# Altium footprint library Active.PcbLib: 325 footprints (part 2 of 23)
Each footprint in its own frame and in the unit in brackets; x right, y up, seen from the top. Pads: shape width x height; smd on the part's side, far side on the other; paste and mask are expansions set on the pad; w line width, h text height; cw(c..) or ccw(c..) is an arc to the next point about the centre after c.
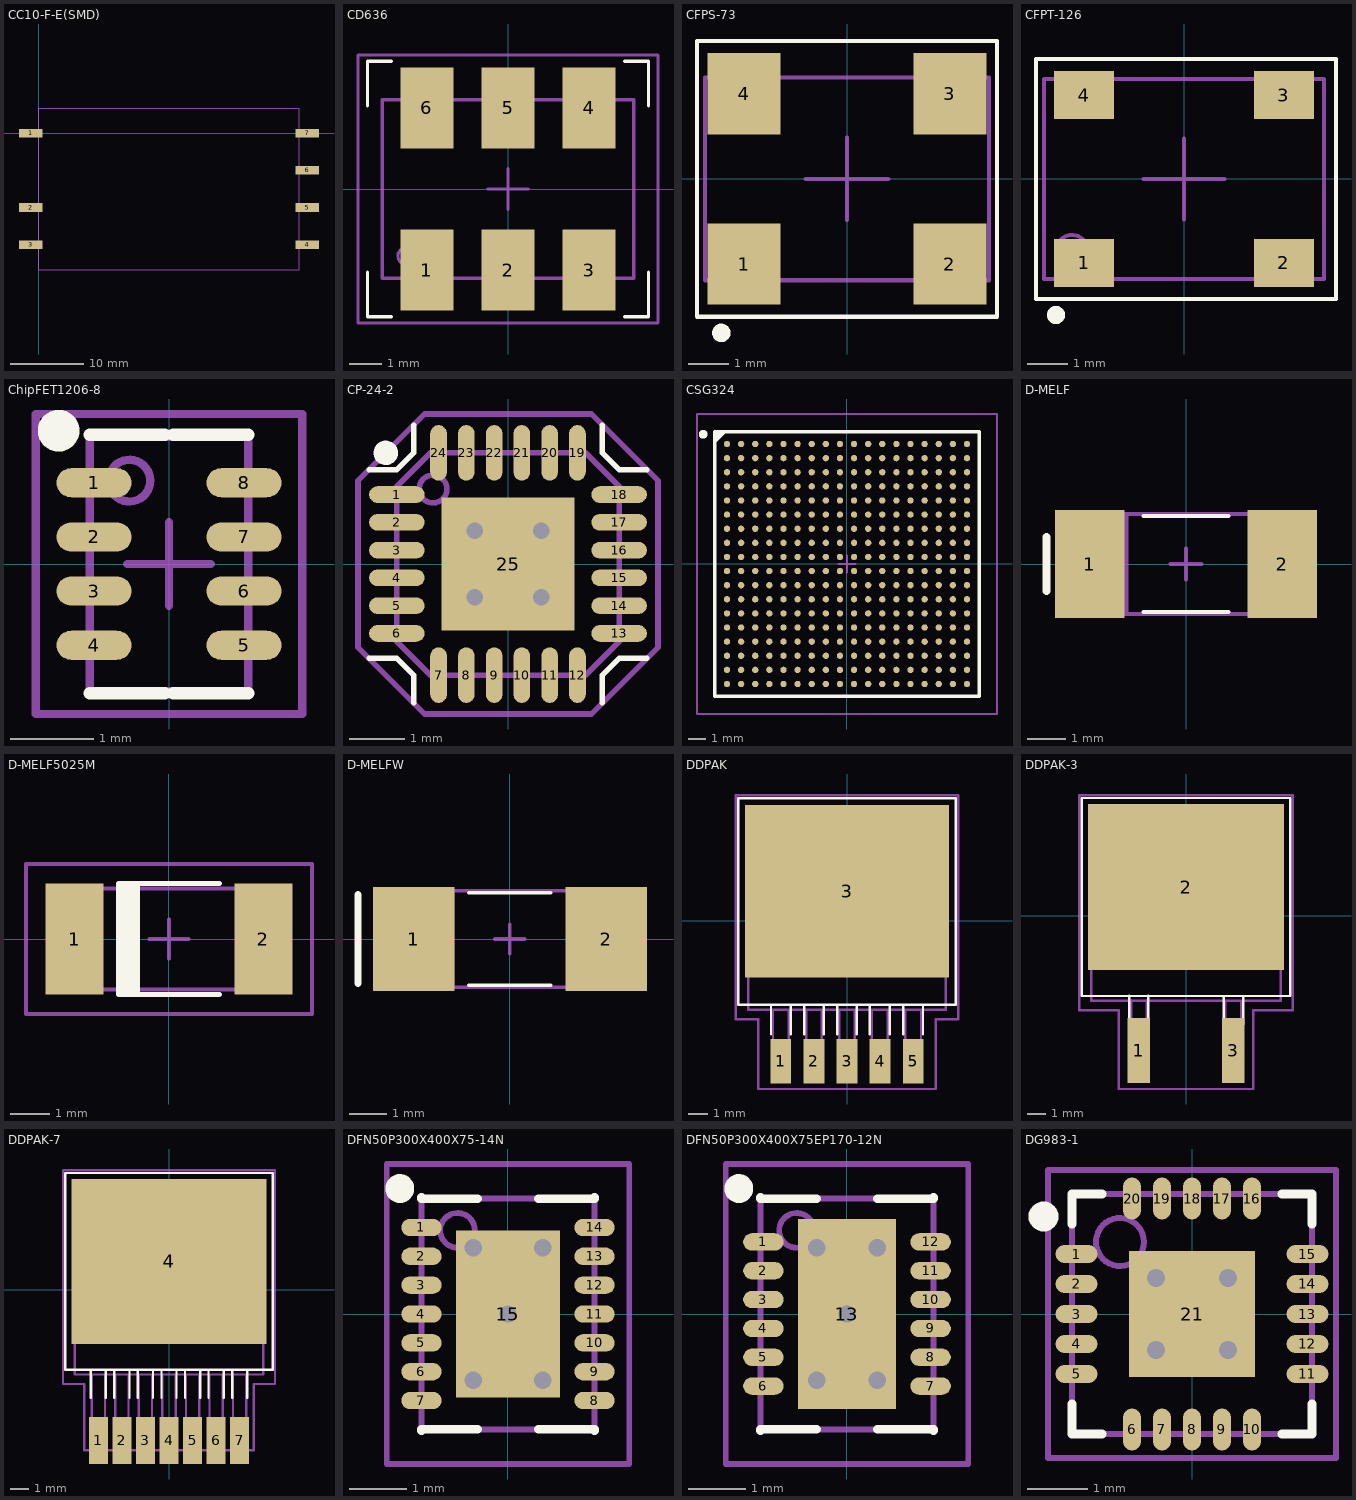
[diagram p1: the footprints below, top view; thin cyan lines are the x and y axes]

## CC10-F-E(SMD) [mm] "CC3-F-E, DIP 11pin, Body 35.56x22.6x8.5mm (LxWxH), R5.08mm"
height 8.5
pads (7):
  rect 3.2x1.2 smd: 1(-1.12,0) 2(-1.12,-10.16) 3(-1.12,-15.24) 4(36.68,-15.24) 5(36.68,-10.16) 6(36.68,-5.08) 7(36.68,0)
Mechanical 13:
  lines w0.127: 0,-18.64 35.56,-18.64 ; 0,-18.62 0,3.38 35.56,3.38 35.56,-18.62
3D body: height 8.5, standoff 0, extent 0,-18.64 35.56,3.38
3D body: height 8.51, standoff 8.5, extent 1.544,-1.016 3.536,0.98

## CD636 [mm] "X3 Frequency Multiplier 6 pin R2.54mm"
height 4.11
pads (6):
  rect 1.65x2.54 smd: 1(-2.54,-2.54) 2(0,-2.54) 3(2.54,-2.54) 4(2.54,2.54) 5(0,2.54) 6(-2.54,2.54)
Top Overlay:
  lines w0.102: -4.4,-2.6 -4.4,-4 -3.65,-4 ; -4.4,2.6 -4.4,4 -3.65,4 ; 3.65,-4 4.4,-4 4.4,-2.6 ; 3.65,4 4.4,4 4.4,2.6
Mechanical 13:
  lines w0.102: -2.95,-2.1 cw(c-3.2,-2.1) -2.95,-2.097 ; -3.937,-2.794 3.937,-2.794 3.937,2.794 -3.937,2.794 -3.937,-2.794
Mechanical 15:
  lines w0.102: -0.635,0 0.635,0 ; 0,-0.635 0,0.635 ; -4.7,-4.2 -4.7,4.2 4.7,4.2 4.7,-4.2 -4.7,-4.2
3D body: height 4.11, standoff 0, extent -3.937,-2.794 3.937,2.794
3D body: height 4.14, standoff 4.11, extent -3.449,-2.349 -2.95,-1.841

## CFPS-73 [mm] "Ceramic oscillator 7x5x1.8mm SMD"
height 1.8
pads (4):
  rect 1.8x2 smd: 1(-2.54,-2.1) 2(2.54,-2.1) 3(2.54,2.1) 4(-2.54,2.1)
Top Overlay:
  circle w0.254: c-3.1,-3.8 r0.1
  lines w0.102: -3.7,-3.4 3.7,-3.4 3.7,3.4 -3.7,3.4 -3.7,-3.4
Mechanical 13:
  circle w0.1: c-2.8,-1.8 r0.4
  lines w0.102: -3.5,-2.5 -3.5,2.5 3.5,2.5 3.5,-2.5 -3.5,-2.5
Mechanical 15:
  lines w0.102: -1.016,0 1.016,0 ; 0,-1.016 0,1.016
3D body: height 1.8, standoff 0, extent -3.5,-2.5 3.5,2.5
3D body: height 1.81, standoff 1.8, extent -3.2,-2.2 -2.4,-1.4

## CFPT-126 [mm] "Ceramic oscillator 7x5x2mm SMD"
height 2
pads (4):
  rect 1.5x1.2 smd: 1(-2.5,-2.1) 2(2.5,-2.1) 3(2.5,2.1) 4(-2.5,2.1)
Top Overlay:
  circle w0.254: c-3.2,-3.4 r0.1
  lines w0.102: -3.7,-3 -3.7,3 3.8,3 3.8,-3 -3.7,-3
Mechanical 13:
  circle w0.1: c-2.8,-1.8 r0.4
  lines w0.102: -3.5,-2.5 3.5,-2.5 3.5,2.5 -3.5,2.5 -3.5,-2.5
Mechanical 15:
  lines w0.102: -1.016,0 1.016,0 ; 0,-1.016 0,1.016
3D body: height 2, standoff 0, extent -3.5,-2.5 3.5,2.5
3D body: height 2.01, standoff 2, extent -3.2,-2.2 -2.4,-1.4

## ChipFET1206-8 [mm] "Chip FET 8-Leads, Body 3,0x1,9mm (max), Pitch 0,65mm, IPC Low Density"
height 1.1
pads (8):
  oval 0.9x0.35 smd mask+0.051: 1(-0.9,0.975) 2(-0.9,0.325) 3(-0.9,-0.325) 4(-0.9,-0.975) 5(0.9,-0.975) 6(0.9,-0.325) 7(0.9,0.325) 8(0.9,0.975)
Top Overlay:
  circle w0.25: c-1.325,1.6 r0.125
  lines w0.15: -0.95,-1.55 -0.05,-1.55 ; -0.95,1.55 -0.05,1.55 ; 0.05,-1.55 0.95,-1.55 ; 0.05,1.55 0.95,1.55
Mechanical 13:
  circle w0.1: c-0.475,1 r0.25
  lines w0.1: -0.95,-1.525 -0.95,1.525 0.95,1.525 0.95,-1.525 -0.95,-1.525
Mechanical 15:
  lines w0.1: -0.5,0 0.5,0 ; 0,-0.5 0,0.5 ; -1.6,-1.8 -1.6,1.8 1.6,1.8 1.6,-1.8 -1.6,-1.8
3D body: height 1.1, standoff 0.01, extent -0.95,-1.525 0.95,1.525
3D body: height 1.11, standoff 1.1, extent -0.73,0.75 -0.23,1.25

## CP-24-2 [mm] "24pin LFCSP_VQ Waffle pack"
height 1.016
pads (25):
  oval 1x0.3 smd mask+0.025: 1(-2,1.25) 2(-2,0.75) 3(-2,0.25) 4(-2,-0.25) 5(-2,-0.75) 6(-2,-1.25) 13(2,-1.25) 14(2,-0.75) 15(2,-0.25) 16(2,0.25) 17(2,0.75) 18(2,1.25)
  oval 0.3x1 smd mask+0.025: 7(-1.25,-2) 8(-0.75,-2) 9(-0.25,-2) 10(0.25,-2) 11(0.75,-2) 12(1.25,-2) 19(1.25,2) 20(0.75,2) 21(0.25,2) 22(-0.25,2) 23(-0.75,2) 24(-1.25,2)
  rect 2.4x2.4 smd paste-5 mask-5: 25(0,0)
via 0.6,-0.6 diameter 0.65 hole 0.3
via 0.6,0.6 diameter 0.65 hole 0.3
via -0.6,0.6 diameter 0.65 hole 0.3
via -0.6,-0.6 diameter 0.65 hole 0.3
Top Overlay:
  circle w0.1: c-2.2,2 r0.17
  circle w0.15: c-2.2,2 r0.06
  lines w0.1: -2.5,-1.7 -2,-1.7 -1.7,-2 -1.7,-2.5 ; -2.5,1.7 -2,1.7 -1.7,2 -1.7,2.5 ; 1.7,-2.5 1.7,-2 2,-1.7 2.5,-1.7 ; 1.7,2.5 1.7,2 2,1.7 2.5,1.7
Top Paste:
  region: -0.45,-1.2 -0.45,-0.95 -0.25,-0.75 0.25,-0.75 0.45,-0.95 0.45,-1.2
  region: 1.2,-0.45 0.95,-0.45 0.75,-0.25 0.75,0.25 0.95,0.45 1.2,0.45
  region: 1.2,0.725 0.975,0.725 0.75,0.95 0.75,1.2 0.975,1.2 1.2,1.2
  region: 0.725,-1.2 0.725,-0.975 0.95,-0.75 1.2,-0.75 1.2,-0.975 1.2,-1.2
  region: -1.2,-0.725 -0.975,-0.725 -0.75,-0.95 -0.75,-1.2 -0.975,-1.2 -1.2,-1.2
  region: -0.725,1.2 -0.725,0.975 -0.95,0.75 -1.2,0.75 -1.2,0.975 -1.2,1.2
  region: -0.25,0.45 -0.45,0.25 -0.45,-0.25 -0.25,-0.45 0.25,-0.45 0.45,-0.25 0.45,0.25 0.25,0.45
  region: -0.45,1.2 -0.45,0.95 -0.25,0.75 0.25,0.75 0.45,0.95 0.45,1.2
  region: -1.2,-0.45 -0.95,-0.45 -0.75,-0.25 -0.75,0.25 -0.95,0.45 -1.2,0.45
Top Solder:
  region: 1.25,1.25 0.6,1.25 0.6,0.9 0.63,0.9 0.717,0.883 0.816,0.816 0.883,0.717 0.9,0.63 0.9,0.6 0.9,0.57 0.883,0.483 0.816,0.384 0.717,0.317 0.63,0.3 0.6,0.3 0.57,0.3 0.483,0.317 0.384,0.384 0.317,0.483 0.3,0.57 0.3,0.6 0.3,0.63 0.317,0.717 0.384,0.816 0.483,0.883 0.57,0.9 0.6,0.9 0.6,1.25 0,1.25 0,0 1.25,0
  region: 1.25,-1.25 0.6,-1.25 0.6,-0.9 0.63,-0.9 0.717,-0.883 0.816,-0.816 0.883,-0.717 0.9,-0.63 0.9,-0.6 0.9,-0.57 0.883,-0.483 0.816,-0.384 0.717,-0.317 0.63,-0.3 0.6,-0.3 0.57,-0.3 0.483,-0.317 0.384,-0.384 0.317,-0.483 0.3,-0.57 0.3,-0.6 0.3,-0.63 0.317,-0.717 0.384,-0.816 0.483,-0.883 0.57,-0.9 0.6,-0.9 0.6,-1.25 0,-1.25 0,0 1.25,0
  region: -1.25,-1.25 -0.6,-1.25 -0.6,-0.9 -0.63,-0.9 -0.717,-0.883 -0.816,-0.816 -0.883,-0.717 -0.9,-0.63 -0.9,-0.6 -0.9,-0.57 -0.883,-0.483 -0.816,-0.384 -0.717,-0.317 -0.63,-0.3 -0.6,-0.3 -0.57,-0.3 -0.483,-0.317 -0.384,-0.384 -0.317,-0.483 -0.3,-0.57 -0.3,-0.6 -0.3,-0.63 -0.317,-0.717 -0.384,-0.816 -0.483,-0.883 -0.57,-0.9 -0.6,-0.9 -0.6,-1.25 0,-1.25 0,0 -1.25,0
  region: -1.25,1.25 -0.6,1.25 -0.6,0.9 -0.63,0.9 -0.717,0.883 -0.816,0.816 -0.883,0.717 -0.9,0.63 -0.9,0.6 -0.9,0.57 -0.883,0.483 -0.816,0.384 -0.717,0.317 -0.63,0.3 -0.6,0.3 -0.57,0.3 -0.483,0.317 -0.384,0.384 -0.317,0.483 -0.3,0.57 -0.3,0.6 -0.3,0.63 -0.317,0.717 -0.384,0.816 -0.483,0.883 -0.57,0.9 -0.6,0.9 -0.6,1.25 0,1.25 0,0 -1.25,0
Mechanical 13:
  circle w0.1: c-1.35,1.35 r0.25
  lines w0.1: -2,-1.4 -1.4,-2 1.4,-2 2,-1.4 2,1.4 1.4,2 1.1,2 -1.4,2 -2,1.4 -2,-1.4
Mechanical 15:
  lines w0.1: -0.4,0 0.4,0 ; 0,-0.4 0,0.4 ; -2.7,-1.5 -2.7,1.5 -1.5,2.7 1.5,2.7 2.7,1.5 2.7,-1.5 1.5,-2.7 -1.5,-2.7 -2.7,-1.5
3D body: height 1.01, standoff 0.99, extent -1.648,1.051 -1.05,1.649
3D body: height 1, standoff 0, extent -2,-2 2,2

## CSG324 [mm] "BGA, 324-Leads, Body 15x15mm, Pitch 0.8mm"
height 1.5
pads (324):
  round 0.36 smd: A1(-6.8,6.8) A2(-6,6.8) A3(-5.2,6.8) A4(-4.4,6.8) A5(-3.6,6.8) A6(-2.8,6.8) A7(-2,6.8) A8(-1.2,6.8) A9(-0.4,6.8) A10(0.4,6.8) A11(1.2,6.8) A12(2,6.8) A13(2.8,6.8) A14(3.6,6.8) A15(4.4,6.8) A16(5.2,6.8) A17(6,6.8) A18(6.8,6.8) B1(-6.8,6) B2(-6,6) B3(-5.2,6) B4(-4.4,6) B5(-3.6,6) B6(-2.8,6) B7(-2,6) B8(-1.2,6) B9(-0.4,6) B10(0.4,6) B11(1.2,6) B12(2,6) B13(2.8,6) B14(3.6,6) B15(4.4,6) B16(5.2,6) B17(6,6) B18(6.8,6) C1(-6.8,5.2) C2(-6,5.2) C3(-5.2,5.2) C4(-4.4,5.2) C5(-3.6,5.2) C6(-2.8,5.2) C7(-2,5.2) C8(-1.2,5.2) C9(-0.4,5.2) C10(0.4,5.2) C11(1.2,5.2) C12(2,5.2) C13(2.8,5.2) C14(3.6,5.2) C15(4.4,5.2) C16(5.2,5.2) C17(6,5.2) C18(6.8,5.2) D1(-6.8,4.4) D2(-6,4.4) D3(-5.2,4.4) D4(-4.4,4.4) D5(-3.6,4.4) D6(-2.8,4.4) D7(-2,4.4) D8(-1.2,4.4) D9(-0.4,4.4) D10(0.4,4.4) D11(1.2,4.4) D12(2,4.4) D13(2.8,4.4) D14(3.6,4.4) D15(4.4,4.4) D16(5.2,4.4) D17(6,4.4) D18(6.8,4.4) E1(-6.8,3.6) E2(-6,3.6) E3(-5.2,3.6) E4(-4.4,3.6) E5(-3.6,3.6) E6(-2.8,3.6) E7(-2,3.6) E8(-1.2,3.6) E9(-0.4,3.6) E10(0.4,3.6) E11(1.2,3.6) E12(2,3.6) E13(2.8,3.6) E14(3.6,3.6) E15(4.4,3.6) E16(5.2,3.6) E17(6,3.6) E18(6.8,3.6) F1(-6.8,2.8) F2(-6,2.8) F3(-5.2,2.8) F4(-4.4,2.8) F5(-3.6,2.8) F6(-2.8,2.8) F7(-2,2.8) F8(-1.2,2.8) F9(-0.4,2.8) F10(0.4,2.8) F11(1.2,2.8) F12(2,2.8) F13(2.8,2.8) F14(3.6,2.8) F15(4.4,2.8) F16(5.2,2.8) F17(6,2.8) F18(6.8,2.8) G1(-6.8,2) G2(-6,2) G3(-5.2,2) G4(-4.4,2) G5(-3.6,2) G6(-2.8,2) G7(-2,2) G8(-1.2,2) G9(-0.4,2) G10(0.4,2) G11(1.2,2) G12(2,2) G13(2.8,2) G14(3.6,2) G15(4.4,2) G16(5.2,2) G17(6,2) G18(6.8,2) H1(-6.8,1.2) H2(-6,1.2) H3(-5.2,1.2) H4(-4.4,1.2) H5(-3.6,1.2) H6(-2.8,1.2) H7(-2,1.2) H8(-1.2,1.2) H9(-0.4,1.2) H10(0.4,1.2) H11(1.2,1.2) H12(2,1.2) H13(2.8,1.2) H14(3.6,1.2) H15(4.4,1.2) H16(5.2,1.2) H17(6,1.2) H18(6.8,1.2) J1(-6.8,0.4) J2(-6,0.4) J3(-5.2,0.4) J4(-4.4,0.4) J5(-3.6,0.4) J6(-2.8,0.4) J7(-2,0.4) J8(-1.2,0.4) J9(-0.4,0.4) J10(0.4,0.4) J11(1.2,0.4) J12(2,0.4) J13(2.8,0.4) J14(3.6,0.4) J15(4.4,0.4) J16(5.2,0.4) J17(6,0.4) J18(6.8,0.4) K1(-6.8,-0.4) K2(-6,-0.4) K3(-5.2,-0.4) K4(-4.4,-0.4) K5(-3.6,-0.4) K6(-2.8,-0.4) K7(-2,-0.4) K8(-1.2,-0.4) K9(-0.4,-0.4) K10(0.4,-0.4) K11(1.2,-0.4) K12(2,-0.4) K13(2.8,-0.4) K14(3.6,-0.4) K15(4.4,-0.4) K16(5.2,-0.4) K17(6,-0.4) K18(6.8,-0.4) L1(-6.8,-1.2) L2(-6,-1.2) L3(-5.2,-1.2) L4(-4.4,-1.2) L5(-3.6,-1.2) L6(-2.8,-1.2) L7(-2,-1.2) L8(-1.2,-1.2) L9(-0.4,-1.2) L10(0.4,-1.2) L11(1.2,-1.2) L12(2,-1.2) L13(2.8,-1.2) L14(3.6,-1.2) L15(4.4,-1.2) L16(5.2,-1.2) L17(6,-1.2) L18(6.8,-1.2) M1(-6.8,-2) M2(-6,-2) M3(-5.2,-2) M4(-4.4,-2) M5(-3.6,-2) M6(-2.8,-2) M7(-2,-2) M8(-1.2,-2) M9(-0.4,-2) M10(0.4,-2) M11(1.2,-2) M12(2,-2) M13(2.8,-2) M14(3.6,-2) M15(4.4,-2) M16(5.2,-2) M17(6,-2) M18(6.8,-2) N1(-6.8,-2.8) N2(-6,-2.8) N3(-5.2,-2.8) N4(-4.4,-2.8) N5(-3.6,-2.8) N6(-2.8,-2.8) N7(-2,-2.8) N8(-1.2,-2.8) N9(-0.4,-2.8) N10(0.4,-2.8) N11(1.2,-2.8) N12(2,-2.8) N13(2.8,-2.8) N14(3.6,-2.8) N15(4.4,-2.8) N16(5.2,-2.8) N17(6,-2.8) N18(6.8,-2.8) P1(-6.8,-3.6) P2(-6,-3.6) P3(-5.2,-3.6) P4(-4.4,-3.6) P5(-3.6,-3.6) P6(-2.8,-3.6) P7(-2,-3.6) P8(-1.2,-3.6) P9(-0.4,-3.6) P10(0.4,-3.6) P11(1.2,-3.6) P12(2,-3.6) P13(2.8,-3.6) P14(3.6,-3.6) P15(4.4,-3.6) P16(5.2,-3.6) P17(6,-3.6) P18(6.8,-3.6) R1(-6.8,-4.4) R2(-6,-4.4) R3(-5.2,-4.4) R4(-4.4,-4.4) R5(-3.6,-4.4) R6(-2.8,-4.4) R7(-2,-4.4) R8(-1.2,-4.4) R9(-0.4,-4.4) R10(0.4,-4.4) R11(1.2,-4.4) R12(2,-4.4) R13(2.8,-4.4) R14(3.6,-4.4) R15(4.4,-4.4) R16(5.2,-4.4) R17(6,-4.4) R18(6.8,-4.4) T1(-6.8,-5.2) T2(-6,-5.2) T3(-5.2,-5.2) T4(-4.4,-5.2) T5(-3.6,-5.2) T6(-2.8,-5.2) T7(-2,-5.2) T8(-1.2,-5.2) T9(-0.4,-5.2) T10(0.4,-5.2) T11(1.2,-5.2) T12(2,-5.2) T13(2.8,-5.2) T14(3.6,-5.2) T15(4.4,-5.2) T16(5.2,-5.2) T17(6,-5.2) T18(6.8,-5.2) U1(-6.8,-6) U2(-6,-6) U3(-5.2,-6) U4(-4.4,-6) U5(-3.6,-6) U6(-2.8,-6) U7(-2,-6) U8(-1.2,-6) U9(-0.4,-6) U10(0.4,-6) U11(1.2,-6) U12(2,-6) U13(2.8,-6) U14(3.6,-6) U15(4.4,-6) U16(5.2,-6) U17(6,-6) U18(6.8,-6) V1(-6.8,-6.8) V2(-6,-6.8) V3(-5.2,-6.8) V4(-4.4,-6.8) V5(-3.6,-6.8) V6(-2.8,-6.8) V7(-2,-6.8) V8(-1.2,-6.8) V9(-0.4,-6.8) V10(0.4,-6.8) V11(1.2,-6.8) V12(2,-6.8) V13(2.8,-6.8) V14(3.6,-6.8) V15(4.4,-6.8) V16(5.2,-6.8) V17(6,-6.8) V18(6.8,-6.8)
Top Overlay:
  circle w0.25: c-8.15,7.35 r0.125
  region: -6.92,7.5 -7.5,6.92 -7.5,7.5
  lines w0.2: -7.5,6.92 -6.92,7.5 ; -7.5,-7.5 -7.5,7.5 7.5,7.5 7.5,-7.5 -7.5,-7.5
Mechanical 13:
  lines w0.1: -7.5,-7.5 -7.5,7.5 7.5,7.5 7.5,-7.5 -7.5,-7.5
Mechanical 15:
  lines w0.1: -0.5,0 0.5,0 ; 0,-0.5 0,0.5 ; -8.5,-8.5 -8.5,8.5 8.5,8.5 8.5,-8.5 -8.5,-8.5
3D body: height 1.51, standoff 1.5, extent -6.9,5.901 -5.904,6.899
3D body: height 1.5, standoff 0, extent -7.5,-7.5 7.5,7.5

## D-MELF [mm] "Diode MELF glass"
height 2.5
pads (2):
  rect 1.8x2.8 smd: 1(-2.5,0) 2(2.5,0)
Top Overlay:
  lines w0.102: -1.1,-1.25 1.1,-1.25 ; -1.1,1.25 1.1,1.25
  lines w0.2: -3.625,-0.7 -3.625,0.7
Mechanical 13:
  lines w0.102: -2.05,-1.25 -2.05,1.25 ; -1.95,-1.25 -1.95,1.25 ; -1.85,-1.25 -1.85,1.25 ; -1.75,-1.25 -1.75,1.25 ; -1.65,-1.25 -1.65,1.25 ; -1.55,-1.25 -1.55,1.25 ; -2.5,-1.3 -2.5,-0.7 -2.5,1.3 2.5,1.3 2.5,-1.3 -2.5,-1.3
Mechanical 15:
  lines w0.102: -0.4,0 0.4,0 ; 0,-0.4 0,0.4
3D body: height 1.6, standoff 0, extent -2.5,-1.3 2.5,1.3

## D-MELF5025M [mm] "MELF Diode, 2-Leads, Body 5,0x2,5mm, IPC Low Density"
height 2.6
pads (2):
  rect 1.5x2.85 smd: 1(-2.425,0) 2(2.425,0)
Top Overlay:
  rectangle: -1.3,-1.425 -0.75,1.425
  lines w0.127: 1.3,-1.425 -1.3,-1.425 -1.3,1.425 1.3,1.425
Mechanical 13:
  rectangle: -2.55,-1.3 -1.864,1.3
  lines w0.1: -2.55,-1.3 2.55,-1.3 2.55,1.3 -2.55,1.3 -2.55,-1.3
Mechanical 15:
  lines w0.1: -0.5,0 0.5,0 ; 0,-0.5 0,0.5 ; -3.675,-1.925 3.675,-1.925 3.675,1.925 -3.675,1.925 -3.675,-1.925
3D body: height 2.6, standoff 0, extent -2.55,-1.3 2.55,1.3

## D-MELFW [mm] "Diode MELF glass wave solder"
height 2.5
pads (2):
  rect 2.2x2.8 smd: 1(-2.6,0) 2(2.6,0)
Top Overlay:
  lines w0.102: -1.1,-1.25 1.1,-1.25 ; -1.1,1.25 1.1,1.25
  lines w0.2: -4.1,-1.2 -4.1,1.2
Mechanical 13:
  lines w0.102: -2.05,-1.25 -2.05,1.25 ; -1.95,-1.25 -1.95,1.25 ; -1.85,-1.25 -1.85,1.25 ; -1.75,-1.25 -1.75,1.25 ; -1.65,-1.25 -1.65,1.25 ; -1.55,-1.25 -1.55,1.25 ; -2.5,-1.3 -2.5,-0.7 -2.5,1.3 2.5,1.3 2.5,-1.3 -2.5,-1.3
Mechanical 15:
  lines w0.102: -0.4,0 0.4,0 ; 0,-0.4 0,0.4
3D body: height 2.72, standoff 0.08, extent -1.6,-1.315 -1,1.315
3D body: height 2.7, standoff 0.1, extent -1.95,-1.3 1.95,1.29
3D body: height 2.7, standoff 0.1, extent 1.95,-1.295 2.5,1.295
3D body: height 2.7, standoff 0.1, extent -2.5,-1.295 -1.95,1.295

## DDPAK [mil]
height 137.8
pads (6):
  rect 42x90 smd: 1(-134,-285) 2(-67,-285) 3(0,-285) 4(67,-285) 5(134,-285)
  rect 414.02x350 smd paste-393.7: 3(0,60)
Top Overlay:
  lines w5: -154,-230 -154,-170 ; -114,-230 -114,-170 ; -87,-230 -87,-170 ; -47,-230 -47,-170 ; -20,-230 -20,-170 ; 20,-230 20,-170 ; 46,-230 46,-170 ; 87,-230 87,-170 ; 114,-230 114,-170 ; 154,-230 154,-170 ; -220,-170 -220,248 220,248 220,-170 -220,-170
Top Paste:
  circle w39.37: c165.35,190.79 r17.72
  circle w39.37: c82.68,190.79 r17.72
  circle w39.37: c-165.35,190.79 r17.72
  circle w39.37: c-82.68,190.79 r17.72
  circle w39.37: c0,190.79 r17.72
  circle w39.37: c165.35,104.17 r17.72
  circle w39.37: c82.68,104.17 r17.72
  circle w39.37: c-165.35,104.17 r17.72
  circle w39.37: c-82.68,104.17 r17.72
  circle w39.37: c0,104.17 r17.72
  circle w39.37: c165.35,17.56 r17.72
  circle w39.37: c82.68,17.56 r17.72
  circle w39.37: c-165.35,17.56 r17.72
  circle w39.37: c-82.68,17.56 r17.72
  circle w39.37: c0,17.56 r17.72
  circle w39.37: c0,-69.06 r17.72
  circle w39.37: c-82.68,-69.06 r17.72
  circle w39.37: c-165.35,-69.06 r17.72
  circle w39.37: c82.68,-69.06 r17.72
  circle w39.37: c165.35,-69.06 r17.72
Mechanical 13:
  lines w5: -150,-180 -150,-325 -118,-325 -118,-180 ; -83,-180 -83,-325 -51,-325 -51,-180 ; -16,-180 -16,-325 16,-325 16,-180 ; 50,-180 50,-325 83,-325 83,-180 ; 118,-180 118,-325 150,-325 150,-180 ; -200,-180 -200,215 -120,230 120,230 200,215 200,-180 -200,-180
  lines w6: -200,170 200,170
Mechanical 15:
  lines w4: -40,-10 40,-10 ; 0,-50 0,30
  lines w5: -225,-200 -225,254 225,254 225,-200 180,-200 180,-341 -180,-341 -180,-200 -225,-200
3D body: height 118.11, standoff 98.43, extent -16,-240 16,-180
3D body: height 175, standoff 0, extent -200,-180 200,170
3D body: height 50, standoff 0, extent -200,170 200,230
3D body: height 98.43, standoff 0, extent -16,-240 16,-220
3D body: height 19.68, standoff 0, extent -16,-325 16,-240
3D body: height 19.68, standoff 0, extent -83,-325 -51,-240
3D body: height 98.43, standoff 0, extent -83,-240 -51,-220
3D body: height 118.11, standoff 98.43, extent -83,-240 -51,-180
3D body: height 19.68, standoff 0, extent -150,-325 -118,-240
3D body: height 98.43, standoff 0, extent -150,-240 -118,-220
3D body: height 118.11, standoff 98.43, extent -150,-240 -118,-180
3D body: height 19.68, standoff 0, extent 50,-325 82,-240
3D body: height 98.43, standoff 0, extent 50,-240 82,-220
3D body: height 118.11, standoff 98.43, extent 50,-240 82,-180
3D body: height 19.68, standoff 0, extent 118,-325 150,-240
3D body: height 98.43, standoff 0, extent 118,-240 150,-220
3D body: height 118.11, standoff 98.43, extent 118,-240 150,-180

## DDPAK-3 [mm] "DDPAK 3pin"
height 3.5
pads (3):
  rect 1.2x3.5 smd: 1(-2.54,-7.239) 3(2.54,-7.239)
  rect 10.516x8.89 smd paste-10: 2(0,1.524)
Top Overlay:
  lines w0.127: -3.035,-5.817 -3.035,-4.293 ; -2.019,-5.817 -2.019,-4.293 ; 2.018,-5.842 2.018,-4.318 ; 3.06,-5.842 3.06,-4.318 ; -5.588,-4.318 5.588,-4.318 5.588,6.299 -5.588,6.299 -5.588,-4.318
Top Paste:
  circle w0.9: c4.2,-1.754 r0.45
  circle w0.9: c2.1,-1.754 r0.45
  circle w0.9: c-4.2,-1.754 r0.45
  circle w0.9: c-2.1,-1.754 r0.45
  circle w0.9: c0,-1.754 r0.45
  circle w0.9: c0,0.446 r0.45
  circle w0.9: c-2.1,0.446 r0.45
  circle w0.9: c-4.2,0.446 r0.45
  circle w0.9: c2.1,0.446 r0.45
  circle w0.9: c4.2,0.446 r0.45
  circle w0.9: c0,2.646 r0.45
  circle w0.9: c-2.1,2.646 r0.45
  circle w0.9: c-4.2,2.646 r0.45
  circle w0.9: c2.1,2.646 r0.45
  circle w0.9: c4.2,2.646 r0.45
  circle w0.9: c0,4.846 r0.45
  circle w0.9: c-2.1,4.846 r0.45
  circle w0.9: c-4.2,4.846 r0.45
  circle w0.9: c2.1,4.846 r0.45
  circle w0.9: c4.2,4.846 r0.45
Mechanical 13:
  lines w0.127: -2.934,-4.547 -2.934,-8.23 -2.121,-8.23 -2.121,-4.547 ; 2.12,-4.572 2.12,-8.255 2.958,-8.255 2.958,-4.572 ; -5.08,-4.572 5.08,-4.572 5.08,5.461 3.048,5.842 -3.048,5.842 -5.08,5.461 -5.08,-4.572
  lines w0.152: -5.08,4.318 5.08,4.318
Mechanical 15:
  lines w0.102: -1.016,-0.254 1.016,-0.254 ; 0,-1.27 0,0.762
  lines w0.127: -5.715,-5.08 -3.6,-5.08 -3.6,-9.3 3.6,-9.3 3.6,-5.08 5.715,-5.08 5.715,6.452 -5.715,6.452 -5.715,-5.08
3D body: height 3, standoff 2.5, extent 2.12,-6.096 2.933,-4.572
3D body: height 2.5, standoff 0, extent 2.12,-6.096 2.933,-5.588
3D body: height 0.5, standoff 0, extent 2.12,-8.255 2.933,-6.096
3D body: height 3, standoff 2.5, extent -2.934,-6.071 -2.121,-4.547
3D body: height 2.5, standoff 0, extent -2.934,-6.071 -2.121,-5.563
3D body: height 0.5, standoff 0, extent -2.934,-8.23 -2.121,-6.071
3D body: height 1.27, standoff 0, extent -5.08,4.318 5.08,5.842
3D body: height 4.44, standoff 0, extent -5.08,-4.572 5.08,4.318

## DDPAK-7 [mil]
height 137.8
pads (8):
  rect 40x100 smd mask+3: 1(-150,-320) 2(-100,-320) 3(-50,-320) 4(0,-320) 5(50,-320) 6(100,-320) 7(150,-320)
  rect 414.02x350 smd paste-393.7: 4(0,60)
Top Overlay:
  lines w5: -166,-230 -166,-170 ; -134,-230 -134,-170 ; -116,-230 -116,-170 ; -84,-230 -84,-170 ; -66,-230 -66,-170 ; -34,-230 -34,-170 ; -16,-230 -16,-170 ; 16,-230 16,-170 ; 34,-230 34,-170 ; 66,-230 66,-170 ; 84,-230 84,-170 ; 116,-230 116,-170 ; 134,-230 134,-170 ; 166,-230 166,-170 ; -220,-170 -220,248 220,248 220,-170 -220,-170
Top Paste:
  circle w39.37: c165.35,190.79 r17.72
  circle w39.37: c82.68,190.79 r17.72
  circle w39.37: c-165.35,190.79 r17.72
  circle w39.37: c-82.68,190.79 r17.72
  circle w39.37: c0,190.79 r17.72
  circle w39.37: c165.35,104.17 r17.72
  circle w39.37: c82.68,104.17 r17.72
  circle w39.37: c-165.35,104.17 r17.72
  circle w39.37: c-82.68,104.17 r17.72
  circle w39.37: c0,104.17 r17.72
  circle w39.37: c165.35,17.56 r17.72
  circle w39.37: c82.68,17.56 r17.72
  circle w39.37: c-165.35,17.56 r17.72
  circle w39.37: c-82.68,17.56 r17.72
  circle w39.37: c0,17.56 r17.72
  circle w39.37: c0,-69.06 r17.72
  circle w39.37: c-82.68,-69.06 r17.72
  circle w39.37: c-165.35,-69.06 r17.72
  circle w39.37: c82.68,-69.06 r17.72
  circle w39.37: c165.35,-69.06 r17.72
Mechanical 13:
  lines w5: -164,-180 -164,-360 -136,-360 -136,-180 ; -114,-180 -114,-360 -86,-360 -86,-180 ; -64,-180 -64,-360 -36,-360 -36,-180 ; -14,-180 -14,-360 14,-360 14,-180 ; 36,-180 36,-360 64,-360 64,-180 ; 86,-180 86,-360 114,-360 114,-180 ; 136,-180 136,-360 164,-360 164,-180 ; -200,-180 -200,215 -120,230 120,230 200,215 200,-180 -200,-180
  lines w6: -200,170 200,170
Mechanical 15:
  lines w4: -40,-10 40,-10 ; 0,-50 0,30
  lines w5: -225,-200 -225,254 225,254 225,-200 180,-200 180,-341 -180,-341 -180,-200 -225,-200
3D body: height 118.11, standoff 98.43, extent -14,-275 14,-180
3D body: height 175, standoff 0, extent -200,-180 200,170
3D body: height 50, standoff 0, extent -200,170 200,230
3D body: height 98.43, standoff 0, extent -14,-275 14,-255
3D body: height 19.68, standoff 0, extent -14,-360 14,-275
3D body: height 19.68, standoff 0, extent -64,-360 -36,-275
3D body: height 98.43, standoff 0, extent -64,-275 -36,-255
3D body: height 118.11, standoff 98.43, extent -64,-275 -36,-180
3D body: height 19.68, standoff 0, extent -114,-360 -86,-275
3D body: height 98.43, standoff 0, extent -114,-275 -86,-255
3D body: height 118.11, standoff 98.43, extent -114,-275 -86,-180
3D body: height 19.68, standoff 0, extent -164,-360 -136,-275
3D body: height 98.43, standoff 0, extent -164,-275 -136,-255
3D body: height 118.11, standoff 98.43, extent -164,-275 -136,-180
3D body: height 19.68, standoff 0, extent 36,-360 64,-275
3D body: height 98.43, standoff 0, extent 36,-275 64,-255
3D body: height 118.11, standoff 98.43, extent 36,-275 64,-180
3D body: height 19.68, standoff 0, extent 86,-360 114,-275
3D body: height 98.43, standoff 0, extent 86,-275 114,-255
3D body: height 118.11, standoff 98.43, extent 86,-275 114,-180
3D body: height 19.68, standoff 0, extent 136,-360 164,-275
3D body: height 98.43, standoff 0, extent 136,-275 164,-255
3D body: height 118.11, standoff 98.43, extent 136,-275 164,-180

## DFN50P300X400X75-14N [mm] "DFN, 14-Leads, Body 4,0x3,0mm (max), Pitch 0,50mm, IPC Medium Density"
height 0.75
pads (15):
  oval 0.7x0.3 smd: 1(-1.5,1.5) 2(-1.5,1) 3(-1.5,0.5) 4(-1.5,0) 5(-1.5,-0.5) 6(-1.5,-1) 7(-1.5,-1.5) 8(1.5,-1.5) 9(1.5,-1) 10(1.5,-0.5) 11(1.5,0) 12(1.5,0.5) 13(1.5,1) 14(1.5,1.5)
  rect 1.8x2.9 smd paste-5 mask+0.051: 15(0,0)
via -0.6,-1.15 diameter 0.6 hole 0.3
via 0.6,-1.15 diameter 0.6 hole 0.3
via 0.6,1.15 diameter 0.6 hole 0.3
via -0.6,1.15 diameter 0.6 hole 0.3
via 0,0 diameter 0.6 hole 0.3
Top Overlay:
  circle w0.25: c-1.875,2.175 r0.125
  lines w0.15: -1.5,-2.025 -1.5,-2 -0.525,-2 ; -1.5,2.025 -1.5,2 -0.525,2 ; 0.525,-2 1.5,-2 1.5,-2.025 ; 0.525,2 1.5,2 1.5,2.025
Top Paste:
  region: -0.9,0.85 -0.4,0.85 -0.1,0.55 -0.1,0.325 -0.325,0.1 -0.9,0.1
  region: -0.3,1.45 -0.3,1.025 -0.078,0.803 0.075,0.8 0.3,1.025 0.3,1.45
  region: -0.9,-0.85 -0.4,-0.85 -0.1,-0.55 -0.1,-0.325 -0.325,-0.1 -0.9,-0.1
  region: 0.9,0.85 0.4,0.85 0.1,0.55 0.1,0.325 0.325,0.1 0.9,0.1
  region: 0.3,-1.45 0.3,-1.025 0.078,-0.803 -0.075,-0.8 -0.3,-1.025 -0.3,-1.45
  region: 0.9,-0.85 0.4,-0.85 0.1,-0.55 0.1,-0.325 0.325,-0.1 0.9,-0.1
Mechanical 13:
  circle w0.1: c-0.875,1.45 r0.3
  lines w0.1: -1.5,-2 1.5,-2 1.5,2 -1.5,2 -1.5,-2
Mechanical 15:
  lines w0.1: -0.5,0 0.5,0 ; 0,-0.5 0,0.5 ; -2.1,-2.6 2.1,-2.6 2.1,2.6 -2.1,2.6 -2.1,-2.6
3D body: height 0.76, standoff 0.75, extent -1.175,1.15 -0.577,1.749
3D body: height 0.75, standoff 0, extent -1.5,-2 1.5,2

## DFN50P300X400X75EP170-12N [mm] "DFN, 12-Leads, Body 4,0x3,0mm (max), Pitch 0,50mm, IPC Medium Density"
height 0.75
pads (13):
  oval 0.7x0.3 smd mask+0.05: 1(-1.45,1.25) 2(-1.45,0.75) 3(-1.45,0.25) 4(-1.45,-0.25) 5(-1.45,-0.75) 6(-1.45,-1.25) 7(1.45,-1.25) 8(1.45,-0.75) 9(1.45,-0.25) 10(1.45,0.25) 11(1.45,0.75) 12(1.45,1.25)
  rect 1.7x3.3 smd paste-5 mask-5: 13(0,0)
via -0.525,-1.15 diameter 0.6 hole 0.3
via 0.525,-1.15 diameter 0.6 hole 0.3
via 0.525,1.15 diameter 0.6 hole 0.3
via -0.525,1.15 diameter 0.6 hole 0.3
via 0,0 diameter 0.6 hole 0.3
Top Overlay:
  circle w0.25: c-1.875,2.175 r0.125
  lines w0.15: -1.5,-2.025 -1.5,-2 -0.525,-2 ; -1.5,2.025 -1.5,2 -0.525,2 ; 0.525,-2 1.5,-2 1.5,-2.025 ; 0.525,2 1.5,2 1.5,2.025
Top Paste:
  region: -0.9,0.85 -0.4,0.85 -0.1,0.55 -0.1,0.325 -0.325,0.1 -0.9,0.1
  region: -0.9,-0.85 -0.4,-0.85 -0.1,-0.55 -0.1,-0.325 -0.325,-0.1 -0.9,-0.1
  region: 0.9,0.85 0.4,0.85 0.1,0.55 0.1,0.325 0.325,0.1 0.9,0.1
  region: 0.9,-0.85 0.4,-0.85 0.1,-0.55 0.1,-0.325 0.325,-0.1 0.9,-0.1
  region: -0.225,1.7 -0.225,0.925 0.225,0.925 0.225,1.7
  region: -0.225,-1.7 -0.225,-0.925 0.225,-0.925 0.225,-1.7
Top Solder:
  region: -0.85,0.85 -0.525,0.85 -0.495,0.85 -0.408,0.867 -0.309,0.934 -0.242,1.033 -0.225,1.12 -0.225,1.15 -0.225,1.18 -0.243,1.268 -0.292,1.342 -0.313,1.363 -0.4,1.45 -0.4,1.65 0,1.65 0,0.3 -0.03,0.3 -0.117,0.283 -0.216,0.216 -0.283,0.117 -0.3,0.03 -0.3,0 -0.85,0
  region: 0.85,0.85 0.525,0.85 0.495,0.85 0.408,0.867 0.309,0.934 0.242,1.033 0.225,1.12 0.225,1.15 0.225,1.18 0.243,1.268 0.292,1.342 0.313,1.363 0.4,1.45 0.4,1.65 0,1.65 0,0.3 0.03,0.3 0.117,0.283 0.216,0.216 0.283,0.117 0.3,0.03 0.3,0 0.85,0
  region: 0.85,-0.85 0.525,-0.85 0.495,-0.85 0.408,-0.867 0.309,-0.934 0.242,-1.033 0.225,-1.12 0.225,-1.15 0.225,-1.18 0.243,-1.268 0.292,-1.342 0.313,-1.363 0.4,-1.45 0.4,-1.65 0,-1.65 0,-0.3 0.03,-0.3 0.117,-0.283 0.216,-0.216 0.283,-0.117 0.3,-0.03 0.3,0 0.85,0
  region: -0.85,-0.85 -0.525,-0.85 -0.495,-0.85 -0.408,-0.867 -0.309,-0.934 -0.242,-1.033 -0.225,-1.12 -0.225,-1.15 -0.225,-1.18 -0.243,-1.268 -0.292,-1.342 -0.313,-1.363 -0.4,-1.45 -0.4,-1.65 0,-1.65 0,-0.3 -0.03,-0.3 -0.117,-0.283 -0.216,-0.216 -0.283,-0.117 -0.3,-0.03 -0.3,0 -0.85,0
Mechanical 13:
  circle w0.1: c-0.875,1.45 r0.3
  lines w0.1: -1.5,-2 1.5,-2 1.5,2 -1.5,2 -1.5,-2
Mechanical 15:
  lines w0.1: -0.5,0 0.5,0 ; 0,-0.5 0,0.5 ; -2.1,-2.6 2.1,-2.6 2.1,2.6 -2.1,2.6 -2.1,-2.6
3D body: height 0.76, standoff 0.75, extent -1.177,1.149 -0.577,1.749
3D body: height 0.75, standoff 0, extent -1.5,-2 1.5,2

## DG983-1 [mm] "QFN, 20-Leads, Body 4,0x4,0mm (max), Pitch 0,50mm, IPC Medium Density"
height 0.9
pads (21):
  oval 0.7x0.3 smd mask+0.025: 1(-1.925,1) 2(-1.925,0.5) 3(-1.925,0) 4(-1.925,-0.5) 5(-1.925,-1) 11(1.925,-1) 12(1.925,-0.5) 13(1.925,0) 14(1.925,0.5) 15(1.925,1)
  oval 0.3x0.7 smd mask+0.025: 6(-1,-1.925) 7(-0.5,-1.925) 8(0,-1.925) 9(0.5,-1.925) 10(1,-1.925) 16(1,1.925) 17(0.5,1.925) 18(0,1.925) 19(-0.5,1.925) 20(-1,1.925)
  rect 2.1x2.1 smd paste-5 mask-5: 21(0,0)
via -0.6,-0.6 diameter 0.65 hole 0.3
via -0.6,0.6 diameter 0.65 hole 0.3
via 0.6,0.6 diameter 0.65 hole 0.3
via 0.6,-0.6 diameter 0.65 hole 0.3
Top Overlay:
  circle w0.25: c-2.475,1.625 r0.125
  lines w0.15: -2,-1.5 -2,-2 -1.5,-2 ; -2,1.5 -2,2 -1.5,2 ; 1.5,-2 2,-2 2,-1.5 ; 1.5,2 2,2 2,1.5
Top Paste:
  region: -0.25,0.45 -0.45,0.25 -0.45,-0.25 -0.25,-0.45 0.25,-0.45 0.45,-0.25 0.45,0.25 0.25,0.45
  region: -1.05,-0.725 -0.975,-0.725 -0.75,-0.95 -0.75,-1.05 -1.05,-1.05
  region: -0.45,-1.05 -0.45,-0.95 -0.25,-0.75 0.25,-0.75 0.45,-0.95 0.45,-1.05
  region: 1.05,-0.45 0.95,-0.45 0.75,-0.25 0.75,0.25 0.95,0.45 1.05,0.45
  region: 0.725,-1.05 0.725,-0.975 0.95,-0.75 1.05,-0.75 1.05,-1.05
  region: 0.45,1.05 0.45,0.95 0.25,0.75 -0.25,0.75 -0.45,0.95 -0.45,1.05
  region: 1.05,0.725 0.975,0.725 0.75,0.95 0.75,1.05 1.05,1.05
  region: -1.05,0.45 -0.95,0.45 -0.75,0.25 -0.75,-0.25 -0.95,-0.45 -1.05,-0.45
  region: -0.725,1.05 -0.725,0.975 -0.95,0.75 -1.05,0.75 -1.05,1.05
Top Solder:
  region: -1.1,1.1 -0.6,1.1 -0.6,0.9 -0.63,0.9 -0.717,0.883 -0.816,0.816 -0.883,0.717 -0.9,0.63 -0.9,0.6 -0.9,0.57 -0.883,0.483 -0.816,0.384 -0.717,0.317 -0.63,0.3 -0.6,0.3 -0.57,0.3 -0.483,0.317 -0.384,0.384 -0.317,0.483 -0.3,0.57 -0.3,0.6 -0.3,0.63 -0.317,0.717 -0.384,0.816 -0.483,0.883 -0.57,0.9 -0.6,0.9 -0.6,1.1 0,1.1 0,0 -1.1,0
  region: -1.1,-1.1 -0.6,-1.1 -0.6,-0.9 -0.63,-0.9 -0.717,-0.883 -0.816,-0.816 -0.883,-0.717 -0.9,-0.63 -0.9,-0.6 -0.9,-0.57 -0.883,-0.483 -0.816,-0.384 -0.717,-0.317 -0.63,-0.3 -0.6,-0.3 -0.57,-0.3 -0.483,-0.317 -0.384,-0.384 -0.317,-0.483 -0.3,-0.57 -0.3,-0.6 -0.3,-0.63 -0.317,-0.717 -0.384,-0.816 -0.483,-0.883 -0.57,-0.9 -0.6,-0.9 -0.6,-1.1 0,-1.1 0,0 -1.1,0
  region: 1.1,-1.1 0.6,-1.1 0.6,-0.9 0.63,-0.9 0.717,-0.883 0.816,-0.816 0.883,-0.717 0.9,-0.63 0.9,-0.6 0.9,-0.57 0.883,-0.483 0.816,-0.384 0.717,-0.317 0.63,-0.3 0.6,-0.3 0.57,-0.3 0.483,-0.317 0.384,-0.384 0.317,-0.483 0.3,-0.57 0.3,-0.6 0.3,-0.63 0.317,-0.717 0.384,-0.816 0.483,-0.883 0.57,-0.9 0.6,-0.9 0.6,-1.1 0,-1.1 0,0 1.1,0
  region: 1.1,1.1 0.6,1.1 0.6,0.9 0.63,0.9 0.717,0.883 0.816,0.816 0.883,0.717 0.9,0.63 0.9,0.6 0.9,0.57 0.883,0.483 0.816,0.384 0.717,0.317 0.63,0.3 0.6,0.3 0.57,0.3 0.483,0.317 0.384,0.384 0.317,0.483 0.3,0.57 0.3,0.6 0.3,0.63 0.317,0.717 0.384,0.816 0.483,0.883 0.57,0.9 0.6,0.9 0.6,1.1 0,1.1 0,0 1.1,0
Mechanical 13:
  circle w0.1: c-1.2,1.2 r0.4
  lines w0.1: -2,-2 -2,2 2,2 2,-2 -2,-2
Mechanical 15:
  lines w0.1: -0.5,0 0.5,0 ; -0.4,0 0.4,0 ; 0,-0.5 0,0.5 ; 0,-0.4 0,0.4 ; -2.4,-2.4 -2.4,2.4 2.4,2.4 2.4,-2.4 -2.4,-2.4
3D body: height 0.91, standoff 0.9, extent -1.6,0.8 -0.803,1.598
3D body: height 0.9, standoff 0.01, extent -2,-2 2,2